# Altium footprint library PCBLIB.PcbLib: 775 footprints (part 26 of 49)
Each footprint in its own frame and in the unit in brackets; x right, y up, seen from the top. Pads: shape width x height; smd on the part's side, far side on the other; paste and mask are expansions set on the pad; w line width, h text height; cw(c..) or ccw(c..) is an arc to the next point about the centre after c.
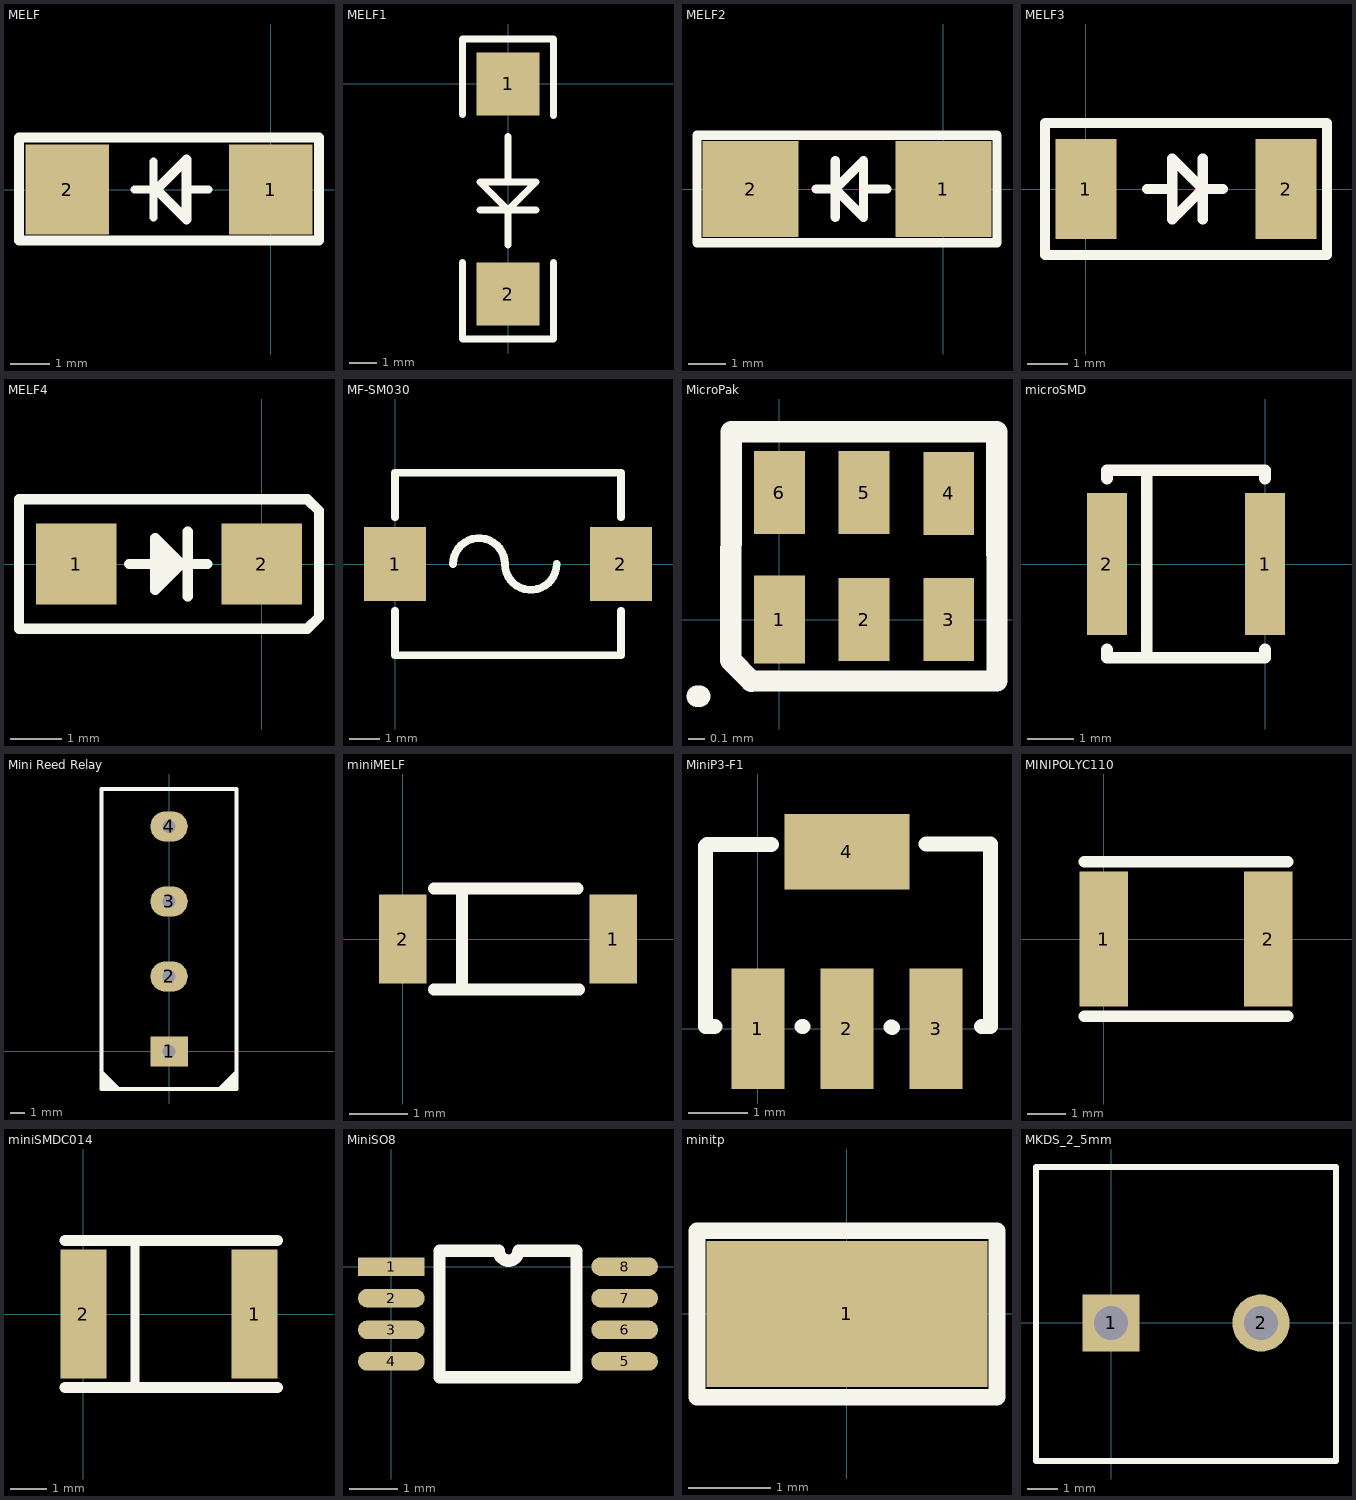
[diagram p25: the footprints below, top view; thin cyan lines are the x and y axes]

## MELF [mil]
pads (2):
  rect 83x90 smd: 1(0,0) 2(-203,0)
TopOverlay:
  lines w8: -136,0 -117,0 ; -117,-28 -117,28 ; -84,0 -62,0
  lines w10: -251,-51 -251,52 48,52 48,-51 -251,-51 ; -114,0 -84,-30 -84,0 -84,30 -114,0

## MELF1 [mil]
pads (2):
  rect 90x90 smd: 1(0,0) 2(0,-300)
TopOverlay:
  lines w10: -65,-255 -65,-364 65,-364 65,-255 ; -65,-44 -65,64 -55,64 55,64 65,64 65,9 65,-45 ; -40,-180 40,-180 ; 0,-230 0,-180 ; 0,-75 0,-140 ; 0,-180 -40,-140 0,-140 ; 0,-180 40,-140 0,-140

## MELF2 [mm]
height 1.778
pads (2):
  rect 2.6x2.6 smd: 1(0,0) 2(-5.207,0)
TopOverlay:
  lines w0.254: -3.429,0 -2.921,0 ; -2.921,-0.762 -2.921,0 ; -2.921,0.762 -2.921,0 ; -1.524,0 -2.159,0 ; -2.921,0 -2.159,-0.762 -2.159,0 ; -2.921,0 -2.159,0.762 -2.159,0 ; -6.655,-1.448 -6.655,1.448 1.448,1.448 1.448,-1.448 -6.655,-1.448
Mechanical4:
  text ".1" at -3.15,-0.711 h0.03

## MELF3 [mil]
pads (2):
  rect 60x98 smd: 1(0,0) 2(197,0)
TopOverlay:
  lines w10: 60,0 85,0 ; 115,-30 115,0 ; 115,30 115,0 ; 135,0 115,0 ; 85,0 85,30 115,0 ; 85,0 85,-30 115,0 ; -40,-65 237,-65 237,65 -40,65 -40,-65
Mechanical4:
  text ".1" at 0,0 h1

## MELF4 [mil]
height 100
pads (2):
  rect 62x62 smd: 1(-143,0) 2(0,0)
TopOverlay:
  lines w8: -102,0 -82,0 ; -77,10 -77,-5 -77,-10 -72,-5 -72,5 ; -57,-25 -57,25 ; -42,0 -82,0 ; -82,0 -82,-20 -62,0 -82,20 -82,0 ; -187,-50 -187,50 5,50 10,50 35,50 44,41 44,-41 35,-50 10,-50 -187,-50
Mechanical4:
  text ".095" at -170,0 h1
  text ".1" at 0,0 h1

## MF-SM030 [mil]
pads (2):
  rect 80x95 smd: 1(0,0) 2(290,0)
TopOverlay:
  lines w10: 0,-60 0,-117 290,-117 290,-60 ; 0,60 0,117 290,117 290,60 ; 74.52,0 cw(c107.76,0) 141,0 ccw(c174.24,0) 207.48,0
Mechanical4:
  text ".110" at 0,0 h1

## MicroPak [mm]
height 0.55
pads (6):
  rect 0.3x0.52 smd: 1(0,0)
  rect 0.3x0.49 smd: 2(0.5,0) 3(1,0) 4(1,0.745) 5(0.5,0.75) 6(0,0.75)
TopOverlay:
  lines w0.127: -0.487,-0.454 -0.472,-0.454 ; -0.289,-0.241 -0.284,1.11 1.284,1.109 1.285,-0.362 -0.165,-0.364 -0.289,-0.241

## microSMD [mil]
pads (2):
  rect 34x121 smd: 1(0,0) 2(-135,0)
TopOverlay:
  lines w10: -135,-73 -135,-80 0,-80 0,-73 ; -135,73 -135,80 0,80 0,73 ; -101,-80 -101,80
Mechanical4:
  text ".040" at -135,0 h1

## Mini Reed Relay [mil]
height 300
pads (4):
  rect 100x80 hole 35: 1(0,0)
  oval 100x80 hole 35: 2(0,200) 3(0,400) 4(0,600)
TopOverlay:
  lines w10: -180,-86 -180,-87 -167,-100 ; -180,-79 -178,-79 -157,-100 ; -180,-65 -145,-100 ; -180,-55 -135,-100 ; -179,-58 -137,-100 ; 135,-100 180,-55 ; 145,-100 180,-65 ; 157,-100 176,-81 ; 169,-100 180,-89 ; -180,-100 -180,700 180,700 180,-100 -180,-100

## miniMELF [mil]
height 65
pads (2):
  rect 32x60 smd: 1(142,0) 2(0,0)
TopOverlay:
  lines w8: 21,-34 119,-34 ; 21,34 118,34 ; 40,-33 40,34

## MiniP3-F1 [mil]
height 59.05
pads (4):
  rect 35x80 smd: 1(0,0) 2(59.05,0) 3(118.11,0)
  rect 83x50 smd: 4(59.05,117.48)
TopOverlay:
  lines w10: -28.66,1.5 -34.7,1.5 -34.7,121.23 -33.9,122.04 8.84,122.04 ; 29.39,1.5 29.8,1.5 ; 88.25,1.1 88.65,1.1 89.06,0.7 ; 111.63,122.44 154.36,122.44 154.36,109.94 154.36,91 154.36,1.5 ; 148.31,1.5 154.36,1.5 ; 154.36,1.5 154.36,1.5

## MINIPOLYC110 [mil]
pads (2):
  rect 50x140 smd: 1(0,0) 2(170,0)
TopOverlay:
  lines w12: -20,-80 190,-80 ; -20,80 190,80
Mechanical4:
  text ".055" at 0,0 h1

## miniSMDC014 [mil]
height 0.52
pads (2):
  rect 50x140 smd: 1(186,0) 2(0,0)
TopOverlay:
  lines w10: 56,-80 56,80
  lines w12: -20,-80 211,-80 ; -20,80 211,80
Mechanical4:
  text ".055" at 0,0 h1

## MiniSO8 [mil]
pads (8):
  rect 54x15 smd: 1(0,0)
  oval 54x15 smd: 2(0,-25.6) 3(0,-51.2) 4(0,-76.8) 5(189,-76.8) 6(189,-51.2) 7(189,-25.6) 8(189,0)
TopOverlay:
  lines w10: 39,-89.6 39,12.8 87,12.8 ccw(c95,12.8) 103,12.8 150,12.8 150,-89.6 39,-89.6
Mechanical4:
  text ".040" at 0,0 h1

## minitp [mil]
pads (1):
  rect 135x70 smd: 1(0,0)
TopOverlay:
  lines w8: -72,-40 -72,40 72,40 72,-40 -72,-40

## MKDS_2_5mm [mil]
height 543.31
pads (2):
  rect 75x75 hole 45: 1(0,0)
  round 75 hole 45: 2(196.85,0)
TopOverlay:
  lines w7.48: -98.43,-181.1 -98.43,204.72 295.28,204.72 295.28,-181.1 -98.43,-181.1